# Altium schematic symbol library jlcpcb_2025_04_resistors_extended_2010.schlib: 1697 symbols (part 3 of 9) (continued)
## AC2010JK-075K1L
designator R?  Resistance: 5.1kΩ  (hidden comment: *)
Resistor, 5.1kΩ, ±5%, 750mW, ±100ppm/℃, -55℃~+155℃, SMD 2010; Manufacturer: Uniroyal; Manufacturer Part Number: AC2010JK-075K1L; Supplier 1: LCSC; Supplier Part Number 1: C230924; JLCPCB Part Number: C230924; Power Rating: 750mW; Category: Resistors; Package Size: 2010; JLCPCB Basic Part: Yes; Tolerance: ±5%; Temperature Coefficient: ±100ppm/℃; Temperature Rating: -55℃~+155℃; ComponentLink1Description: Datasheet; ComponentLink1URL: https://wmsc.lcsc.com/wmsc/upload/file/pdf/v2/lcsc/2209061730_YAGEO-AC2010JK-075K1L_C230924.pdf; ComponentLink2Description: JLCPCB Part URL; ComponentLink2URL: https://jlcpcb.com/partdetail/C230924
pins: 1, 2
1 alternate drawing of the same symbol

## AC2010JK-0710RL
designator R?  Resistance: 10Ω  (hidden comment: *)
Resistor, 10Ω, ±5%, 750mW, 200V, ±200ppm/℃, -55℃~+155℃, SMD 2010; Manufacturer: Uniroyal; Manufacturer Part Number: AC2010JK-0710RL; Supplier 1: LCSC; Supplier Part Number 1: C230833; JLCPCB Part Number: C230833; Power Rating: 750mW; Category: Resistors; Package Size: 2010; JLCPCB Basic Part: Yes; Tolerance: ±5%; Voltage Rating: 200V; Temperature Coefficient: ±200ppm/℃; Temperature Rating: -55℃~+155℃; ComponentLink1Description: Datasheet; ComponentLink1URL: https://wmsc.lcsc.com/wmsc/upload/file/pdf/v2/lcsc/1912111437_YAGEO-AC2010JK-0710RL_C230833.pdf; ComponentLink2Description: JLCPCB Part URL; ComponentLink2URL: https://jlcpcb.com/partdetail/C230833
pins: 1, 2
1 alternate drawing of the same symbol

## AC2010JK-0715RL
designator R?  Resistance: 15Ω  (hidden comment: *)
Resistor, 15Ω, ±5%, 750mW, ±100ppm/℃, -55℃~+155℃, SMD 2010; Manufacturer: Uniroyal; Manufacturer Part Number: AC2010JK-0715RL; Supplier 1: LCSC; Supplier Part Number 1: C230849; JLCPCB Part Number: C230849; Power Rating: 750mW; Category: Resistors; Package Size: 2010; JLCPCB Basic Part: Yes; Tolerance: ±5%; Temperature Coefficient: ±100ppm/℃; Temperature Rating: -55℃~+155℃; ComponentLink1Description: Datasheet; ComponentLink1URL: https://wmsc.lcsc.com/wmsc/upload/file/pdf/v2/lcsc/2209191401_YAGEO-AC2010JK-0715RL_C230849.pdf; ComponentLink2Description: JLCPCB Part URL; ComponentLink2URL: https://jlcpcb.com/partdetail/C230849
pins: 1, 2
1 alternate drawing of the same symbol

## AC2010JK-0751RL
designator R?  Resistance: 51Ω  (hidden comment: *)
Resistor, 51Ω, ±5%, 750mW, 500V, ±100ppm/℃, -55℃~+155℃, SMD 2010; Manufacturer: Uniroyal; Manufacturer Part Number: AC2010JK-0751RL; Supplier 1: LCSC; Supplier Part Number 1: C230919; JLCPCB Part Number: C230919; Power Rating: 750mW; Category: Resistors; Package Size: 2010; JLCPCB Basic Part: Yes; Tolerance: ±5%; Voltage Rating: 500V; Temperature Coefficient: ±100ppm/℃; Temperature Rating: -55℃~+155℃; ComponentLink1Description: Datasheet; ComponentLink1URL: https://wmsc.lcsc.com/wmsc/upload/file/pdf/v2/lcsc/2206241815_YAGEO-AC2010JK-0751RL_C230919.pdf; ComponentLink2Description: JLCPCB Part URL; ComponentLink2URL: https://jlcpcb.com/partdetail/C230919
pins: 1, 2
1 alternate drawing of the same symbol

## AC2010JK-07100KL
designator R?  Resistance: 100kΩ  (hidden comment: *)
Resistor, 100kΩ, ±5%, 750mW, 200V, ±100ppm/℃, -55℃~+155℃, SMD 2010; Manufacturer: Uniroyal; Manufacturer Part Number: AC2010JK-07100KL; Supplier 1: LCSC; Supplier Part Number 1: C230829; JLCPCB Part Number: C230829; Power Rating: 750mW; Category: Resistors; Package Size: 2010; JLCPCB Basic Part: Yes; Tolerance: ±5%; Voltage Rating: 200V; Temperature Coefficient: ±100ppm/℃; Temperature Rating: -55℃~+155℃; ComponentLink1Description: Datasheet; ComponentLink1URL: https://wmsc.lcsc.com/wmsc/upload/file/pdf/v2/lcsc/2203210916_YAGEO-AC2010JK-07100KL_C230829.pdf; ComponentLink2Description: JLCPCB Part URL; ComponentLink2URL: https://jlcpcb.com/partdetail/C230829
pins: 1, 2
1 alternate drawing of the same symbol

## AC2010JK-07100RL
designator R?  Resistance: 100Ω  (hidden comment: *)
Resistor, 100Ω, ±5%, 750mW, 200V, ±100ppm/℃, -55℃~+155℃, SMD 2010; Manufacturer: Uniroyal; Manufacturer Part Number: AC2010JK-07100RL; Supplier 1: LCSC; Supplier Part Number 1: C230830; JLCPCB Part Number: C230830; Power Rating: 750mW; Category: Resistors; Package Size: 2010; JLCPCB Basic Part: Yes; Tolerance: ±5%; Voltage Rating: 200V; Temperature Coefficient: ±100ppm/℃; Temperature Rating: -55℃~+155℃; ComponentLink1Description: Datasheet; ComponentLink1URL: https://wmsc.lcsc.com/wmsc/upload/file/pdf/v2/lcsc/2111171830_YAGEO-AC2010JK-07100RL_C230830.pdf; ComponentLink2Description: JLCPCB Part URL; ComponentLink2URL: https://jlcpcb.com/partdetail/C230830
pins: 1, 2
1 alternate drawing of the same symbol

## AC2010JK-07120KL
designator R?  Resistance: 120kΩ  (hidden comment: *)
Resistor, 120kΩ, ±5%, 750mW, 200V, ±100ppm/℃, -55℃~+155℃, SMD 2010; Manufacturer: Uniroyal; Manufacturer Part Number: AC2010JK-07120KL; Supplier 1: LCSC; Supplier Part Number 1: C230838; JLCPCB Part Number: C230838; Power Rating: 750mW; Category: Resistors; Package Size: 2010; JLCPCB Basic Part: Yes; Tolerance: ±5%; Voltage Rating: 200V; Temperature Coefficient: ±100ppm/℃; Temperature Rating: -55℃~+155℃; ComponentLink1Description: Datasheet; ComponentLink1URL: https://wmsc.lcsc.com/wmsc/upload/file/pdf/v2/lcsc/2112131730_YAGEO-AC2010JK-07120KL_C230838.pdf; ComponentLink2Description: JLCPCB Part URL; ComponentLink2URL: https://jlcpcb.com/partdetail/C230838
pins: 1, 2
1 alternate drawing of the same symbol

## AC2010JK-07150RL
designator R?  Resistance: 150Ω  (hidden comment: *)
Resistor, 150Ω, ±5%, 750mW, ±100ppm/℃, -55℃~+155℃, SMD 2010; Manufacturer: Uniroyal; Manufacturer Part Number: AC2010JK-07150RL; Supplier 1: LCSC; Supplier Part Number 1: C230847; JLCPCB Part Number: C230847; Power Rating: 750mW; Category: Resistors; Package Size: 2010; JLCPCB Basic Part: Yes; Tolerance: ±5%; Temperature Coefficient: ±100ppm/℃; Temperature Rating: -55℃~+155℃; ComponentLink1Description: Datasheet; ComponentLink1URL: https://wmsc.lcsc.com/wmsc/upload/file/pdf/v2/lcsc/2111101730_YAGEO-AC2010JK-07150RL_C230847.pdf; ComponentLink2Description: JLCPCB Part URL; ComponentLink2URL: https://jlcpcb.com/partdetail/C230847
pins: 1, 2
1 alternate drawing of the same symbol

## AC2010JK-07180RL
designator R?  Resistance: 180Ω  (hidden comment: *)
Resistor, 180Ω, ±5%, 750mW, 200V, ±100ppm/℃, -55℃~+155℃, SMD 2010; Manufacturer: Uniroyal; Manufacturer Part Number: AC2010JK-07180RL; Supplier 1: LCSC; Supplier Part Number 1: C230855; JLCPCB Part Number: C230855; Power Rating: 750mW; Category: Resistors; Package Size: 2010; JLCPCB Basic Part: Yes; Tolerance: ±5%; Voltage Rating: 200V; Temperature Coefficient: ±100ppm/℃; Temperature Rating: -55℃~+155℃; ComponentLink1Description: Datasheet; ComponentLink1URL: https://wmsc.lcsc.com/wmsc/upload/file/pdf/v2/lcsc/2112131730_YAGEO-AC2010JK-07180RL_C230855.pdf; ComponentLink2Description: JLCPCB Part URL; ComponentLink2URL: https://jlcpcb.com/partdetail/C230855
pins: 1, 2
1 alternate drawing of the same symbol

## AC2010JK-07200KL
designator R?  Resistance: 200kΩ  (hidden comment: *)
Resistor, 200kΩ, ±5%, 750mW, ±100ppm/℃, -55℃~+155℃, SMD 2010; Manufacturer: Uniroyal; Manufacturer Part Number: AC2010JK-07200KL; Supplier 1: LCSC; Supplier Part Number 1: C230866; JLCPCB Part Number: C230866; Power Rating: 750mW; Category: Resistors; Package Size: 2010; JLCPCB Basic Part: Yes; Tolerance: ±5%; Temperature Coefficient: ±100ppm/℃; Temperature Rating: -55℃~+155℃; ComponentLink1Description: Datasheet; ComponentLink1URL: https://wmsc.lcsc.com/wmsc/upload/file/pdf/v2/lcsc/2209191401_YAGEO-AC2010JK-07200KL_C230866.pdf; ComponentLink2Description: JLCPCB Part URL; ComponentLink2URL: https://jlcpcb.com/partdetail/C230866
pins: 1, 2
1 alternate drawing of the same symbol

## AC2010JK-07240RL
designator R?  Resistance: 240Ω  (hidden comment: *)
Resistor, 240Ω, ±5%, 750mW, ±100ppm/℃, -55℃~+155℃, SMD 2010; Manufacturer: Uniroyal; Manufacturer Part Number: AC2010JK-07240RL; Supplier 1: LCSC; Supplier Part Number 1: C230875; JLCPCB Part Number: C230875; Power Rating: 750mW; Category: Resistors; Package Size: 2010; JLCPCB Basic Part: Yes; Tolerance: ±5%; Temperature Coefficient: ±100ppm/℃; Temperature Rating: -55℃~+155℃; ComponentLink1Description: Datasheet; ComponentLink1URL: https://wmsc.lcsc.com/wmsc/upload/file/pdf/v2/lcsc/2111101730_YAGEO-AC2010JK-07240RL_C230875.pdf; ComponentLink2Description: JLCPCB Part URL; ComponentLink2URL: https://jlcpcb.com/partdetail/C230875
pins: 1, 2
1 alternate drawing of the same symbol

## AC2010JK-07360RL
designator R?  Resistance: 360Ω  (hidden comment: *)
Resistor, 360Ω, ±5%, 750mW, 200V, ±100ppm/℃, -55℃~+155℃, SMD 2010; Manufacturer: Uniroyal; Manufacturer Part Number: AC2010JK-07360RL; Supplier 1: LCSC; Supplier Part Number 1: C230895; JLCPCB Part Number: C230895; Power Rating: 750mW; Category: Resistors; Package Size: 2010; JLCPCB Basic Part: Yes; Tolerance: ±5%; Voltage Rating: 200V; Temperature Coefficient: ±100ppm/℃; Temperature Rating: -55℃~+155℃; ComponentLink1Description: Datasheet; ComponentLink1URL: https://wmsc.lcsc.com/wmsc/upload/file/pdf/v2/lcsc/2203081130_YAGEO-AC2010JK-07360RL_C230895.pdf; ComponentLink2Description: JLCPCB Part URL; ComponentLink2URL: https://jlcpcb.com/partdetail/C230895
pins: 1, 2
1 alternate drawing of the same symbol

## AC2010JK-07390RL
designator R?  Resistance: 390Ω  (hidden comment: *)
Resistor, 390Ω, ±5%, 750mW, 200V, ±100ppm/℃, -55℃~+155℃, SMD 2010; Manufacturer: Uniroyal; Manufacturer Part Number: AC2010JK-07390RL; Supplier 1: LCSC; Supplier Part Number 1: C230899; JLCPCB Part Number: C230899; Power Rating: 750mW; Category: Resistors; Package Size: 2010; JLCPCB Basic Part: Yes; Tolerance: ±5%; Voltage Rating: 200V; Temperature Coefficient: ±100ppm/℃; Temperature Rating: -55℃~+155℃; ComponentLink1Description: Datasheet; ComponentLink1URL: https://wmsc.lcsc.com/wmsc/upload/file/pdf/v2/lcsc/2110191430_YAGEO-AC2010JK-07390RL_C230899.pdf; ComponentLink2Description: JLCPCB Part URL; ComponentLink2URL: https://jlcpcb.com/partdetail/C230899
pins: 1, 2
1 alternate drawing of the same symbol

## AC2010JK-07470RL
designator R?  Resistance: 470Ω  (hidden comment: *)
Resistor, 470Ω, ±5%, 750mW, 200V, ±100ppm/℃, -55℃~+155℃, SMD 2010; Manufacturer: Uniroyal; Manufacturer Part Number: AC2010JK-07470RL; Supplier 1: LCSC; Supplier Part Number 1: C230911; JLCPCB Part Number: C230911; Power Rating: 750mW; Category: Resistors; Package Size: 2010; JLCPCB Basic Part: Yes; Tolerance: ±5%; Voltage Rating: 200V; Temperature Coefficient: ±100ppm/℃; Temperature Rating: -55℃~+155℃; ComponentLink1Description: Datasheet; ComponentLink1URL: https://wmsc.lcsc.com/wmsc/upload/file/pdf/v2/lcsc/2304140030_YAGEO-AC2010JK-07470RL_C230911.pdf; ComponentLink2Description: JLCPCB Part URL; ComponentLink2URL: https://jlcpcb.com/partdetail/C230911
pins: 1, 2
1 alternate drawing of the same symbol

## AC2010JK-07510RL
designator R?  Resistance: 510Ω  (hidden comment: *)
Resistor, 510Ω, ±5%, 750mW, ±100ppm/℃, -55℃~+155℃, SMD 2010; Manufacturer: Uniroyal; Manufacturer Part Number: AC2010JK-07510RL; Supplier 1: LCSC; Supplier Part Number 1: C230917; JLCPCB Part Number: C230917; Power Rating: 750mW; Category: Resistors; Package Size: 2010; JLCPCB Basic Part: Yes; Tolerance: ±5%; Temperature Coefficient: ±100ppm/℃; Temperature Rating: -55℃~+155℃; ComponentLink1Description: Datasheet; ComponentLink1URL: https://wmsc.lcsc.com/wmsc/upload/file/pdf/v2/lcsc/2111101730_YAGEO-AC2010JK-07510RL_C230917.pdf; ComponentLink2Description: JLCPCB Part URL; ComponentLink2URL: https://jlcpcb.com/partdetail/C230917
pins: 1, 2
1 alternate drawing of the same symbol

## AC2010JK-07620RL
designator R?  Resistance: 620Ω  (hidden comment: *)
Resistor, 620Ω, ±5%, 750mW, 200V, ±100ppm/℃, -55℃~+155℃, SMD 2010; Manufacturer: Uniroyal; Manufacturer Part Number: AC2010JK-07620RL; Supplier 1: LCSC; Supplier Part Number 1: C230927; JLCPCB Part Number: C230927; Power Rating: 750mW; Category: Resistors; Package Size: 2010; JLCPCB Basic Part: Yes; Tolerance: ±5%; Voltage Rating: 200V; Temperature Coefficient: ±100ppm/℃; Temperature Rating: -55℃~+155℃; ComponentLink1Description: Datasheet; ComponentLink1URL: https://wmsc.lcsc.com/wmsc/upload/file/pdf/v2/lcsc/2111171830_YAGEO-AC2010JK-07620RL_C230927.pdf; ComponentLink2Description: JLCPCB Part URL; ComponentLink2URL: https://jlcpcb.com/partdetail/C230927
pins: 1, 2
1 alternate drawing of the same symbol

## AECR2010F0000K9
designator R?  Resistance: 0Ω  (hidden comment: *)
Resistor, 0Ω, ±1%, 750mW, SMD 2010; Manufacturer: Uniroyal; Manufacturer Part Number: AECR2010F0000K9; Supplier 1: LCSC; Supplier Part Number 1: C351874; JLCPCB Part Number: C351874; Power Rating: 750mW; Category: Resistors; Package Size: 2010; JLCPCB Basic Part: Yes; Tolerance: ±1%; ComponentLink1Description: Datasheet; ComponentLink1URL: https://wmsc.lcsc.com/wmsc/upload/file/pdf/v2/lcsc/2304140030_RESI-AECR2010F0000K9_C351874.pdf; ComponentLink2Description: JLCPCB Part URL; ComponentLink2URL: https://jlcpcb.com/partdetail/C351874
pins: 1, 2
1 alternate drawing of the same symbol

## AECR2010F1M00K9
designator R?  Resistance: 1MΩ  (hidden comment: *)
Resistor, 1MΩ, ±1%, 750mW, 200V, ±100ppm/℃, -55℃~+125℃, SMD 2010; Manufacturer: Uniroyal; Manufacturer Part Number: AECR2010F1M00K9; Supplier 1: LCSC; Supplier Part Number 1: C351857; JLCPCB Part Number: C351857; Power Rating: 750mW; Category: Resistors; Package Size: 2010; JLCPCB Basic Part: Yes; Tolerance: ±1%; Voltage Rating: 200V; Temperature Coefficient: ±100ppm/℃; Temperature Rating: -55℃~+125℃; ComponentLink1Description: Datasheet; ComponentLink1URL: https://wmsc.lcsc.com/wmsc/upload/file/pdf/v2/lcsc/2304140030_RESI-AECR2010F1M00K9_C351857.pdf; ComponentLink2Description: JLCPCB Part URL; ComponentLink2URL: https://jlcpcb.com/partdetail/C351857
pins: 1, 2
1 alternate drawing of the same symbol

## AECR2010F1R50S9
designator R?  Resistance: 1.5Ω  (hidden comment: *)
Resistor, 1.5Ω, ±1%, 750mW, ±250ppm/℃, SMD 2010; Manufacturer: Uniroyal; Manufacturer Part Number: AECR2010F1R50S9; Supplier 1: LCSC; Supplier Part Number 1: C2849029; JLCPCB Part Number: C2849029; Power Rating: 750mW; Category: Resistors; Package Size: 2010; JLCPCB Basic Part: Yes; Tolerance: ±1%; Temperature Coefficient: ±250ppm/℃; ComponentLink1Description: Datasheet; ComponentLink1URL: https://wmsc.lcsc.com/wmsc/upload/file/pdf/v2/lcsc/2311171200_RESI-AECR2010F1R50S9_C2849029.pdf; ComponentLink2Description: JLCPCB Part URL; ComponentLink2URL: https://jlcpcb.com/partdetail/C2849029
pins: 1, 2
1 alternate drawing of the same symbol

## AECR2010F120RK9
designator R?  Resistance: 120Ω  (hidden comment: *)
Resistor, 120Ω, ±1%, 750mW, SMD 2010; Manufacturer: Uniroyal; Manufacturer Part Number: AECR2010F120RK9; Supplier 1: LCSC; Supplier Part Number 1: C351867; JLCPCB Part Number: C351867; Power Rating: 750mW; Category: Resistors; Package Size: 2010; JLCPCB Basic Part: Yes; Tolerance: ±1%; ComponentLink1Description: Datasheet; ComponentLink1URL: https://wmsc.lcsc.com/wmsc/upload/file/pdf/v2/lcsc/2304140030_RESI-AECR2010F120RK9_C351867.pdf; ComponentLink2Description: JLCPCB Part URL; ComponentLink2URL: https://jlcpcb.com/partdetail/C351867
pins: 1, 2
1 alternate drawing of the same symbol

## AECR2010F510RK9
designator R?  Resistance: 510Ω  (hidden comment: *)
Resistor, 510Ω, ±1%, 750mW, 200V, ±100ppm/℃, -55℃~+125℃, SMD 2010; Manufacturer: Uniroyal; Manufacturer Part Number: AECR2010F510RK9; Supplier 1: LCSC; Supplier Part Number 1: C351766; JLCPCB Part Number: C351766; Power Rating: 750mW; Category: Resistors; Package Size: 2010; JLCPCB Basic Part: Yes; Tolerance: ±1%; Voltage Rating: 200V; Temperature Coefficient: ±100ppm/℃; Temperature Rating: -55℃~+125℃; ComponentLink1Description: Datasheet; ComponentLink1URL: https://wmsc.lcsc.com/wmsc/upload/file/pdf/v2/lcsc/2304140030_RESI-AECR2010F510RK9_C351766.pdf; ComponentLink2Description: JLCPCB Part URL; ComponentLink2URL: https://jlcpcb.com/partdetail/C351766
pins: 1, 2
1 alternate drawing of the same symbol

## AF2010FK-0722RL
designator R?  Resistance: 22Ω  (hidden comment: *)
Resistor, 22Ω, ±1%, 750mW, 200V, ±100ppm/℃, -55℃~+155℃, SMD 2010; Manufacturer: Uniroyal; Manufacturer Part Number: AF2010FK-0722RL; Supplier 1: LCSC; Supplier Part Number 1: C2936606; JLCPCB Part Number: C2936606; Power Rating: 750mW; Category: Resistors; Package Size: 2010; JLCPCB Basic Part: Yes; Tolerance: ±1%; Voltage Rating: 200V; Temperature Coefficient: ±100ppm/℃; Temperature Rating: -55℃~+155℃; ComponentLink1Description: Datasheet; ComponentLink1URL: https://wmsc.lcsc.com/wmsc/upload/file/pdf/v2/lcsc/2201121730_YAGEO-AF2010FK-0722RL_C2936606.pdf; ComponentLink2Description: JLCPCB Part URL; ComponentLink2URL: https://jlcpcb.com/partdetail/C2936606
pins: 1, 2
1 alternate drawing of the same symbol

## AR10BTC9650
designator R?  Resistance: 965Ω  (hidden comment: *)
Resistor, 965Ω, ±0.1%, 250mW, 150V, ±25ppm/℃, -55℃~+155℃, SMD 2010; Manufacturer: Uniroyal; Manufacturer Part Number: AR10BTC9650; Supplier 1: LCSC; Supplier Part Number 1: C465456; JLCPCB Part Number: C465456; Power Rating: 250mW; Category: Resistors; Package Size: 2010; JLCPCB Basic Part: Yes; Tolerance: ±0.1%; Voltage Rating: 150V; Temperature Coefficient: ±25ppm/℃; Temperature Rating: -55℃~+155℃; ComponentLink1Description: Datasheet; ComponentLink1URL: https://wmsc.lcsc.com/wmsc/upload/file/pdf/v2/lcsc/2304140030_Viking-Tech-AR10BTC9650_C465456.pdf; ComponentLink2Description: JLCPCB Part URL; ComponentLink2URL: https://jlcpcb.com/partdetail/C465456
pins: 1, 2
1 alternate drawing of the same symbol

## AR10BTS2500
designator R?  Resistance: 250Ω  (hidden comment: *)
Resistor, 250Ω, ±0.1%, 250mW, 150V, ±5ppm/℃, -55℃~+155℃, SMD 2010; Manufacturer: Uniroyal; Manufacturer Part Number: AR10BTS2500; Supplier 1: LCSC; Supplier Part Number 1: C374841; JLCPCB Part Number: C374841; Power Rating: 250mW; Category: Resistors; Package Size: 2010; JLCPCB Basic Part: Yes; Tolerance: ±0.1%; Voltage Rating: 150V; Temperature Coefficient: ±5ppm/℃; Temperature Rating: -55℃~+155℃; ComponentLink1Description: Datasheet; ComponentLink1URL: https://wmsc.lcsc.com/wmsc/upload/file/pdf/v2/lcsc/2304140030_Viking-Tech-AR10BTS2500_C374841.pdf; ComponentLink2Description: JLCPCB Part URL; ComponentLink2URL: https://jlcpcb.com/partdetail/C374841
pins: 1, 2
1 alternate drawing of the same symbol

## AR10FTCO0500
designator R?  Resistance: 50Ω  (hidden comment: *)
Resistor, 50Ω, ±1%, 333.333mW, ±25ppm/℃, SMD 2010; Manufacturer: Uniroyal; Manufacturer Part Number: AR10FTCO0500; Supplier 1: LCSC; Supplier Part Number 1: C3294591; JLCPCB Part Number: C3294591; Power Rating: 333.333mW; Category: Resistors; Package Size: 2010; JLCPCB Basic Part: Yes; Tolerance: ±1%; Temperature Coefficient: ±25ppm/℃; ComponentLink1Description: Datasheet; ComponentLink1URL: https://wmsc.lcsc.com/wmsc/upload/file/pdf/v2/lcsc/2206301900_Viking-Tech-AR10FTCO0500_C3294591.pdf; ComponentLink2Description: JLCPCB Part URL; ComponentLink2URL: https://jlcpcb.com/partdetail/C3294591
pins: 1, 2
1 alternate drawing of the same symbol

## AS101AJ010JT4E
designator R?  Resistance: 1Ω  (hidden comment: *)
Resistor, 1Ω, ±5%, 1.5W, ±400ppm/℃, SMD 2010; Manufacturer: Uniroyal; Manufacturer Part Number: AS101AJ010JT4E; Supplier 1: LCSC; Supplier Part Number 1: C965990; JLCPCB Part Number: C965990; Power Rating: 1.5W; Category: Resistors; Package Size: 2010; JLCPCB Basic Part: Yes; Tolerance: ±5%; Temperature Coefficient: ±400ppm/℃; ComponentLink1Description: Datasheet; ComponentLink1URL: https://wmsc.lcsc.com/wmsc/upload/file/pdf/v2/lcsc/2304140030_UNI-ROYAL-Uniroyal-Elec-AS101AJ010JT4E_C965990.pdf; ComponentLink2Description: JLCPCB Part URL; ComponentLink2URL: https://jlcpcb.com/partdetail/C965990
pins: 1, 2
1 alternate drawing of the same symbol

## AS101AJ020JT4E
designator R?  Resistance: 2Ω  (hidden comment: *)
Resistor, 2Ω, ±5%, 1.5W, ±400ppm/℃, SMD 2010; Manufacturer: Uniroyal; Manufacturer Part Number: AS101AJ020JT4E; Supplier 1: LCSC; Supplier Part Number 1: C965983; JLCPCB Part Number: C965983; Power Rating: 1.5W; Category: Resistors; Package Size: 2010; JLCPCB Basic Part: Yes; Tolerance: ±5%; Temperature Coefficient: ±400ppm/℃; ComponentLink1Description: Datasheet; ComponentLink1URL: https://wmsc.lcsc.com/wmsc/upload/file/pdf/v2/lcsc/2304140030_UNI-ROYAL-Uniroyal-Elec-AS101AJ020JT4E_C965983.pdf; ComponentLink2Description: JLCPCB Part URL; ComponentLink2URL: https://jlcpcb.com/partdetail/C965983
pins: 1, 2
1 alternate drawing of the same symbol

## AS101AJ022JT4E
designator R?  Resistance: 2.2Ω  (hidden comment: *)
Resistor, 2.2Ω, ±5%, 1.5W, ±400ppm/℃, SMD 2010; Manufacturer: Uniroyal; Manufacturer Part Number: AS101AJ022JT4E; Supplier 1: LCSC; Supplier Part Number 1: C965979; JLCPCB Part Number: C965979; Power Rating: 1.5W; Category: Resistors; Package Size: 2010; JLCPCB Basic Part: Yes; Tolerance: ±5%; Temperature Coefficient: ±400ppm/℃; ComponentLink1Description: Datasheet; ComponentLink1URL: https://wmsc.lcsc.com/wmsc/upload/file/pdf/v2/lcsc/2304140030_UNI-ROYAL-Uniroyal-Elec-AS101AJ022JT4E_C965979.pdf; ComponentLink2Description: JLCPCB Part URL; ComponentLink2URL: https://jlcpcb.com/partdetail/C965979
pins: 1, 2
1 alternate drawing of the same symbol

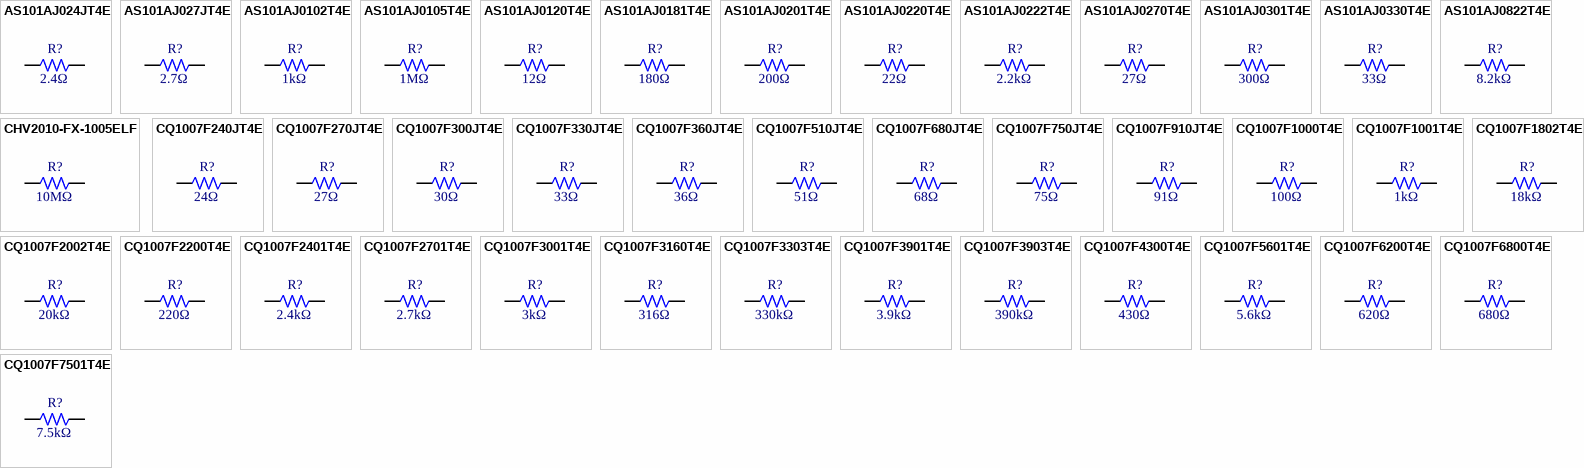
[diagram p14: symbols AS101AJ024JT4E to CQ1007F7501T4E]

## AS101AJ024JT4E
designator R?  Resistance: 2.4Ω  (hidden comment: *)
Resistor, 2.4Ω, ±5%, 1.5W, ±400ppm/℃, SMD 2010; Manufacturer: Uniroyal; Manufacturer Part Number: AS101AJ024JT4E; Supplier 1: LCSC; Supplier Part Number 1: C965976; JLCPCB Part Number: C965976; Power Rating: 1.5W; Category: Resistors; Package Size: 2010; JLCPCB Basic Part: Yes; Tolerance: ±5%; Temperature Coefficient: ±400ppm/℃; ComponentLink1Description: Datasheet; ComponentLink1URL: https://wmsc.lcsc.com/wmsc/upload/file/pdf/v2/lcsc/2304140030_UNI-ROYAL-Uniroyal-Elec-AS101AJ024JT4E_C965976.pdf; ComponentLink2Description: JLCPCB Part URL; ComponentLink2URL: https://jlcpcb.com/partdetail/C965976
pins: 1, 2
1 alternate drawing of the same symbol

## AS101AJ027JT4E
designator R?  Resistance: 2.7Ω  (hidden comment: *)
Resistor, 2.7Ω, ±5%, 1.5W, ±400ppm/℃, SMD 2010; Manufacturer: Uniroyal; Manufacturer Part Number: AS101AJ027JT4E; Supplier 1: LCSC; Supplier Part Number 1: C965973; JLCPCB Part Number: C965973; Power Rating: 1.5W; Category: Resistors; Package Size: 2010; JLCPCB Basic Part: Yes; Tolerance: ±5%; Temperature Coefficient: ±400ppm/℃; ComponentLink1Description: Datasheet; ComponentLink1URL: https://wmsc.lcsc.com/wmsc/upload/file/pdf/v2/lcsc/2304140030_UNI-ROYAL-Uniroyal-Elec-AS101AJ027JT4E_C965973.pdf; ComponentLink2Description: JLCPCB Part URL; ComponentLink2URL: https://jlcpcb.com/partdetail/C965973
pins: 1, 2
1 alternate drawing of the same symbol

## AS101AJ0102T4E
designator R?  Resistance: 1kΩ  (hidden comment: *)
Resistor, 1kΩ, ±5%, 1.5W, ±100ppm/℃, SMD 2010; Manufacturer: Uniroyal; Manufacturer Part Number: AS101AJ0102T4E; Supplier 1: LCSC; Supplier Part Number 1: C965993; JLCPCB Part Number: C965993; Power Rating: 1.5W; Category: Resistors; Package Size: 2010; JLCPCB Basic Part: Yes; Tolerance: ±5%; Temperature Coefficient: ±100ppm/℃; ComponentLink1Description: Datasheet; ComponentLink1URL: https://wmsc.lcsc.com/wmsc/upload/file/pdf/v2/lcsc/2304140030_UNI-ROYAL-Uniroyal-Elec-AS101AJ0102T4E_C965993.pdf; ComponentLink2Description: JLCPCB Part URL; ComponentLink2URL: https://jlcpcb.com/partdetail/C965993
pins: 1, 2
1 alternate drawing of the same symbol

## AS101AJ0105T4E
designator R?  Resistance: 1MΩ  (hidden comment: *)
Resistor, 1MΩ, ±5%, 1.5W, ±100ppm/℃, SMD 2010; Manufacturer: Uniroyal; Manufacturer Part Number: AS101AJ0105T4E; Supplier 1: LCSC; Supplier Part Number 1: C965991; JLCPCB Part Number: C965991; Power Rating: 1.5W; Category: Resistors; Package Size: 2010; JLCPCB Basic Part: Yes; Tolerance: ±5%; Temperature Coefficient: ±100ppm/℃; ComponentLink1Description: Datasheet; ComponentLink1URL: https://wmsc.lcsc.com/wmsc/upload/file/pdf/v2/lcsc/2304140030_UNI-ROYAL-Uniroyal-Elec-AS101AJ0105T4E_C965991.pdf; ComponentLink2Description: JLCPCB Part URL; ComponentLink2URL: https://jlcpcb.com/partdetail/C965991
pins: 1, 2
1 alternate drawing of the same symbol

## AS101AJ0120T4E
designator R?  Resistance: 12Ω  (hidden comment: *)
Resistor, 12Ω, ±5%, 1.5W, ±100ppm/℃, SMD 2010; Manufacturer: Uniroyal; Manufacturer Part Number: AS101AJ0120T4E; Supplier 1: LCSC; Supplier Part Number 1: C965989; JLCPCB Part Number: C965989; Power Rating: 1.5W; Category: Resistors; Package Size: 2010; JLCPCB Basic Part: Yes; Tolerance: ±5%; Temperature Coefficient: ±100ppm/℃; ComponentLink1Description: Datasheet; ComponentLink1URL: https://wmsc.lcsc.com/wmsc/upload/file/pdf/v2/lcsc/2304140030_UNI-ROYAL-Uniroyal-Elec-AS101AJ0120T4E_C965989.pdf; ComponentLink2Description: JLCPCB Part URL; ComponentLink2URL: https://jlcpcb.com/partdetail/C965989
pins: 1, 2
1 alternate drawing of the same symbol

## AS101AJ0181T4E
designator R?  Resistance: 180Ω  (hidden comment: *)
Resistor, 180Ω, ±5%, 1.5W, ±100ppm/℃, SMD 2010; Manufacturer: Uniroyal; Manufacturer Part Number: AS101AJ0181T4E; Supplier 1: LCSC; Supplier Part Number 1: C965987; JLCPCB Part Number: C965987; Power Rating: 1.5W; Category: Resistors; Package Size: 2010; JLCPCB Basic Part: Yes; Tolerance: ±5%; Temperature Coefficient: ±100ppm/℃; ComponentLink1Description: Datasheet; ComponentLink1URL: https://wmsc.lcsc.com/wmsc/upload/file/pdf/v2/lcsc/2304140030_UNI-ROYAL-Uniroyal-Elec-AS101AJ0181T4E_C965987.pdf; ComponentLink2Description: JLCPCB Part URL; ComponentLink2URL: https://jlcpcb.com/partdetail/C965987
pins: 1, 2
1 alternate drawing of the same symbol

## AS101AJ0201T4E
designator R?  Resistance: 200Ω  (hidden comment: *)
Resistor, 200Ω, ±5%, 1.5W, ±100ppm/℃, SMD 2010; Manufacturer: Uniroyal; Manufacturer Part Number: AS101AJ0201T4E; Supplier 1: LCSC; Supplier Part Number 1: C965985; JLCPCB Part Number: C965985; Power Rating: 1.5W; Category: Resistors; Package Size: 2010; JLCPCB Basic Part: Yes; Tolerance: ±5%; Temperature Coefficient: ±100ppm/℃; ComponentLink1Description: Datasheet; ComponentLink1URL: https://wmsc.lcsc.com/wmsc/upload/file/pdf/v2/lcsc/2304140030_UNI-ROYAL-Uniroyal-Elec-AS101AJ0201T4E_C965985.pdf; ComponentLink2Description: JLCPCB Part URL; ComponentLink2URL: https://jlcpcb.com/partdetail/C965985
pins: 1, 2
1 alternate drawing of the same symbol

## AS101AJ0220T4E
designator R?  Resistance: 22Ω  (hidden comment: *)
Resistor, 22Ω, ±5%, 1.5W, ±100ppm/℃, SMD 2010; Manufacturer: Uniroyal; Manufacturer Part Number: AS101AJ0220T4E; Supplier 1: LCSC; Supplier Part Number 1: C965982; JLCPCB Part Number: C965982; Power Rating: 1.5W; Category: Resistors; Package Size: 2010; JLCPCB Basic Part: Yes; Tolerance: ±5%; Temperature Coefficient: ±100ppm/℃; ComponentLink1Description: Datasheet; ComponentLink1URL: https://wmsc.lcsc.com/wmsc/upload/file/pdf/v2/lcsc/2304140030_UNI-ROYAL-Uniroyal-Elec-AS101AJ0220T4E_C965982.pdf; ComponentLink2Description: JLCPCB Part URL; ComponentLink2URL: https://jlcpcb.com/partdetail/C965982
pins: 1, 2
1 alternate drawing of the same symbol

## AS101AJ0222T4E
designator R?  Resistance: 2.2kΩ  (hidden comment: *)
Resistor, 2.2kΩ, ±5%, 1.5W, ±100ppm/℃, SMD 2010; Manufacturer: Uniroyal; Manufacturer Part Number: AS101AJ0222T4E; Supplier 1: LCSC; Supplier Part Number 1: C965981; JLCPCB Part Number: C965981; Power Rating: 1.5W; Category: Resistors; Package Size: 2010; JLCPCB Basic Part: Yes; Tolerance: ±5%; Temperature Coefficient: ±100ppm/℃; ComponentLink1Description: Datasheet; ComponentLink1URL: https://wmsc.lcsc.com/wmsc/upload/file/pdf/v2/lcsc/2304140030_UNI-ROYAL-Uniroyal-Elec-AS101AJ0222T4E_C965981.pdf; ComponentLink2Description: JLCPCB Part URL; ComponentLink2URL: https://jlcpcb.com/partdetail/C965981
pins: 1, 2
1 alternate drawing of the same symbol

## AS101AJ0270T4E
designator R?  Resistance: 27Ω  (hidden comment: *)
Resistor, 27Ω, ±5%, 1.5W, ±100ppm/℃, SMD 2010; Manufacturer: Uniroyal; Manufacturer Part Number: AS101AJ0270T4E; Supplier 1: LCSC; Supplier Part Number 1: C965975; JLCPCB Part Number: C965975; Power Rating: 1.5W; Category: Resistors; Package Size: 2010; JLCPCB Basic Part: Yes; Tolerance: ±5%; Temperature Coefficient: ±100ppm/℃; ComponentLink1Description: Datasheet; ComponentLink1URL: https://wmsc.lcsc.com/wmsc/upload/file/pdf/v2/lcsc/2304140030_UNI-ROYAL-Uniroyal-Elec-AS101AJ0270T4E_C965975.pdf; ComponentLink2Description: JLCPCB Part URL; ComponentLink2URL: https://jlcpcb.com/partdetail/C965975
pins: 1, 2
1 alternate drawing of the same symbol

## AS101AJ0301T4E
designator R?  Resistance: 300Ω  (hidden comment: *)
Resistor, 300Ω, ±5%, 1.5W, ±100ppm/℃, SMD 2010; Manufacturer: Uniroyal; Manufacturer Part Number: AS101AJ0301T4E; Supplier 1: LCSC; Supplier Part Number 1: C965972; JLCPCB Part Number: C965972; Power Rating: 1.5W; Category: Resistors; Package Size: 2010; JLCPCB Basic Part: Yes; Tolerance: ±5%; Temperature Coefficient: ±100ppm/℃; ComponentLink1Description: Datasheet; ComponentLink1URL: https://wmsc.lcsc.com/wmsc/upload/file/pdf/v2/lcsc/2304140030_UNI-ROYAL-Uniroyal-Elec-AS101AJ0301T4E_C965972.pdf; ComponentLink2Description: JLCPCB Part URL; ComponentLink2URL: https://jlcpcb.com/partdetail/C965972
pins: 1, 2
1 alternate drawing of the same symbol

## AS101AJ0330T4E
designator R?  Resistance: 33Ω  (hidden comment: *)
Resistor, 33Ω, ±5%, 1.5W, ±100ppm/℃, SMD 2010; Manufacturer: Uniroyal; Manufacturer Part Number: AS101AJ0330T4E; Supplier 1: LCSC; Supplier Part Number 1: C965971; JLCPCB Part Number: C965971; Power Rating: 1.5W; Category: Resistors; Package Size: 2010; JLCPCB Basic Part: Yes; Tolerance: ±5%; Temperature Coefficient: ±100ppm/℃; ComponentLink1Description: Datasheet; ComponentLink1URL: https://wmsc.lcsc.com/wmsc/upload/file/pdf/v2/lcsc/2304140030_UNI-ROYAL-Uniroyal-Elec-AS101AJ0330T4E_C965971.pdf; ComponentLink2Description: JLCPCB Part URL; ComponentLink2URL: https://jlcpcb.com/partdetail/C965971
pins: 1, 2
1 alternate drawing of the same symbol

## AS101AJ0822T4E
designator R?  Resistance: 8.2kΩ  (hidden comment: *)
Resistor, 8.2kΩ, ±5%, 1.5W, ±100ppm/℃, SMD 2010; Manufacturer: Uniroyal; Manufacturer Part Number: AS101AJ0822T4E; Supplier 1: LCSC; Supplier Part Number 1: C965965; JLCPCB Part Number: C965965; Power Rating: 1.5W; Category: Resistors; Package Size: 2010; JLCPCB Basic Part: Yes; Tolerance: ±5%; Temperature Coefficient: ±100ppm/℃; ComponentLink1Description: Datasheet; ComponentLink1URL: https://wmsc.lcsc.com/wmsc/upload/file/pdf/v2/lcsc/2304140030_UNI-ROYAL-Uniroyal-Elec-AS101AJ0822T4E_C965965.pdf; ComponentLink2Description: JLCPCB Part URL; ComponentLink2URL: https://jlcpcb.com/partdetail/C965965
pins: 1, 2
1 alternate drawing of the same symbol

## CHV2010-FX-1005ELF
designator R?  Resistance: 10MΩ  (hidden comment: *)
Resistor, 10MΩ, ±1%, 500mW, 2kV, ±100ppm/℃, -55℃~+155℃, SMD 2010; Manufacturer: Uniroyal; Manufacturer Part Number: CHV2010-FX-1005ELF; Supplier 1: LCSC; Supplier Part Number 1: C2075112; JLCPCB Part Number: C2075112; Power Rating: 500mW; Category: Resistors; Package Size: 2010; JLCPCB Basic Part: Yes; Tolerance: ±1%; Voltage Rating: 2kV; Temperature Coefficient: ±100ppm/℃; Temperature Rating: -55℃~+155℃; ComponentLink1Description: Datasheet; ComponentLink1URL: https://wmsc.lcsc.com/wmsc/upload/file/pdf/v2/lcsc/2304140030_BOURNS-CHV2010-FX-1005ELF_C2075112.pdf; ComponentLink2Description: JLCPCB Part URL; ComponentLink2URL: https://jlcpcb.com/partdetail/C2075112
pins: 1, 2
1 alternate drawing of the same symbol

## CQ1007F240JT4E
designator R?  Resistance: 24Ω  (hidden comment: *)
Resistor, 24Ω, ±1%, 750mW, 200V, -55℃~+155℃, SMD 2010; Manufacturer: Uniroyal; Manufacturer Part Number: CQ1007F240JT4E; Supplier 1: LCSC; Supplier Part Number 1: C2759562; JLCPCB Part Number: C2759562; Power Rating: 750mW; Category: Resistors; Package Size: 2010; JLCPCB Basic Part: Yes; Tolerance: ±1%; Voltage Rating: 200V; Temperature Rating: -55℃~+155℃; ComponentLink1Description: Datasheet; ComponentLink1URL: https://wmsc.lcsc.com/wmsc/upload/file/pdf/v2/lcsc/2304140030_UNI-ROYAL-Uniroyal-Elec-CQ1007F240JT4E_C2759562.pdf; ComponentLink2Description: JLCPCB Part URL; ComponentLink2URL: https://jlcpcb.com/partdetail/C2759562
pins: 1, 2
1 alternate drawing of the same symbol

## CQ1007F270JT4E
designator R?  Resistance: 27Ω  (hidden comment: *)
Resistor, 27Ω, ±1%, 750mW, 200V, -55℃~+155℃, SMD 2010; Manufacturer: Uniroyal; Manufacturer Part Number: CQ1007F270JT4E; Supplier 1: LCSC; Supplier Part Number 1: C2759561; JLCPCB Part Number: C2759561; Power Rating: 750mW; Category: Resistors; Package Size: 2010; JLCPCB Basic Part: Yes; Tolerance: ±1%; Voltage Rating: 200V; Temperature Rating: -55℃~+155℃; ComponentLink1Description: Datasheet; ComponentLink1URL: https://wmsc.lcsc.com/wmsc/upload/file/pdf/v2/lcsc/2304140030_UNI-ROYAL-Uniroyal-Elec-CQ1007F270JT4E_C2759561.pdf; ComponentLink2Description: JLCPCB Part URL; ComponentLink2URL: https://jlcpcb.com/partdetail/C2759561
pins: 1, 2
1 alternate drawing of the same symbol

## CQ1007F300JT4E
designator R?  Resistance: 30Ω  (hidden comment: *)
Resistor, 30Ω, ±1%, 750mW, ±100ppm/℃, SMD 2010; Manufacturer: Uniroyal; Manufacturer Part Number: CQ1007F300JT4E; Supplier 1: LCSC; Supplier Part Number 1: C966275; JLCPCB Part Number: C966275; Power Rating: 750mW; Category: Resistors; Package Size: 2010; JLCPCB Basic Part: Yes; Tolerance: ±1%; Temperature Coefficient: ±100ppm/℃; ComponentLink1Description: Datasheet; ComponentLink1URL: https://wmsc.lcsc.com/wmsc/upload/file/pdf/v2/lcsc/2304140030_UNI-ROYAL-Uniroyal-Elec-CQ1007F300JT4E_C966275.pdf; ComponentLink2Description: JLCPCB Part URL; ComponentLink2URL: https://jlcpcb.com/partdetail/C966275
pins: 1, 2
1 alternate drawing of the same symbol

## CQ1007F330JT4E
designator R?  Resistance: 33Ω  (hidden comment: *)
Resistor, 33Ω, ±1%, 750mW, 200V, -55℃~+155℃, SMD 2010; Manufacturer: Uniroyal; Manufacturer Part Number: CQ1007F330JT4E; Supplier 1: LCSC; Supplier Part Number 1: C2759560; JLCPCB Part Number: C2759560; Power Rating: 750mW; Category: Resistors; Package Size: 2010; JLCPCB Basic Part: Yes; Tolerance: ±1%; Voltage Rating: 200V; Temperature Rating: -55℃~+155℃; ComponentLink1Description: Datasheet; ComponentLink1URL: https://wmsc.lcsc.com/wmsc/upload/file/pdf/v2/lcsc/2304140030_UNI-ROYAL-Uniroyal-Elec-CQ1007F330JT4E_C2759560.pdf; ComponentLink2Description: JLCPCB Part URL; ComponentLink2URL: https://jlcpcb.com/partdetail/C2759560
pins: 1, 2
1 alternate drawing of the same symbol

## CQ1007F360JT4E
designator R?  Resistance: 36Ω  (hidden comment: *)
Resistor, 36Ω, ±1%, 750mW, ±100ppm/℃, SMD 2010; Manufacturer: Uniroyal; Manufacturer Part Number: CQ1007F360JT4E; Supplier 1: LCSC; Supplier Part Number 1: C966272; JLCPCB Part Number: C966272; Power Rating: 750mW; Category: Resistors; Package Size: 2010; JLCPCB Basic Part: Yes; Tolerance: ±1%; Temperature Coefficient: ±100ppm/℃; ComponentLink1Description: Datasheet; ComponentLink1URL: https://wmsc.lcsc.com/wmsc/upload/file/pdf/v2/lcsc/2304140030_UNI-ROYAL-Uniroyal-Elec-CQ1007F360JT4E_C966272.pdf; ComponentLink2Description: JLCPCB Part URL; ComponentLink2URL: https://jlcpcb.com/partdetail/C966272
pins: 1, 2
1 alternate drawing of the same symbol

## CQ1007F510JT4E
designator R?  Resistance: 51Ω  (hidden comment: *)
Resistor, 51Ω, ±1%, 750mW, ±100ppm/℃, SMD 2010; Manufacturer: Uniroyal; Manufacturer Part Number: CQ1007F510JT4E; Supplier 1: LCSC; Supplier Part Number 1: C966264; JLCPCB Part Number: C966264; Power Rating: 750mW; Category: Resistors; Package Size: 2010; JLCPCB Basic Part: Yes; Tolerance: ±1%; Temperature Coefficient: ±100ppm/℃; ComponentLink1Description: Datasheet; ComponentLink1URL: https://wmsc.lcsc.com/wmsc/upload/file/pdf/v2/lcsc/2304140030_UNI-ROYAL-Uniroyal-Elec-CQ1007F510JT4E_C966264.pdf; ComponentLink2Description: JLCPCB Part URL; ComponentLink2URL: https://jlcpcb.com/partdetail/C966264
pins: 1, 2
1 alternate drawing of the same symbol

## CQ1007F680JT4E
designator R?  Resistance: 68Ω  (hidden comment: *)
Resistor, 68Ω, ±1%, 750mW, ±100ppm/℃, SMD 2010; Manufacturer: Uniroyal; Manufacturer Part Number: CQ1007F680JT4E; Supplier 1: LCSC; Supplier Part Number 1: C966258; JLCPCB Part Number: C966258; Power Rating: 750mW; Category: Resistors; Package Size: 2010; JLCPCB Basic Part: Yes; Tolerance: ±1%; Temperature Coefficient: ±100ppm/℃; ComponentLink1Description: Datasheet; ComponentLink1URL: https://wmsc.lcsc.com/wmsc/upload/file/pdf/v2/lcsc/2304140030_UNI-ROYAL-Uniroyal-Elec-CQ1007F680JT4E_C966258.pdf; ComponentLink2Description: JLCPCB Part URL; ComponentLink2URL: https://jlcpcb.com/partdetail/C966258
pins: 1, 2
1 alternate drawing of the same symbol

## CQ1007F750JT4E
designator R?  Resistance: 75Ω  (hidden comment: *)
Resistor, 75Ω, ±1%, 750mW, ±100ppm/℃, SMD 2010; Manufacturer: Uniroyal; Manufacturer Part Number: CQ1007F750JT4E; Supplier 1: LCSC; Supplier Part Number 1: C966253; JLCPCB Part Number: C966253; Power Rating: 750mW; Category: Resistors; Package Size: 2010; JLCPCB Basic Part: Yes; Tolerance: ±1%; Temperature Coefficient: ±100ppm/℃; ComponentLink1Description: Datasheet; ComponentLink1URL: https://wmsc.lcsc.com/wmsc/upload/file/pdf/v2/lcsc/2304140030_UNI-ROYAL-Uniroyal-Elec-CQ1007F750JT4E_C966253.pdf; ComponentLink2Description: JLCPCB Part URL; ComponentLink2URL: https://jlcpcb.com/partdetail/C966253
pins: 1, 2
1 alternate drawing of the same symbol

## CQ1007F910JT4E
designator R?  Resistance: 91Ω  (hidden comment: *)
Resistor, 91Ω, ±1%, 750mW, ±100ppm/℃, SMD 2010; Manufacturer: Uniroyal; Manufacturer Part Number: CQ1007F910JT4E; Supplier 1: LCSC; Supplier Part Number 1: C966248; JLCPCB Part Number: C966248; Power Rating: 750mW; Category: Resistors; Package Size: 2010; JLCPCB Basic Part: Yes; Tolerance: ±1%; Temperature Coefficient: ±100ppm/℃; ComponentLink1Description: Datasheet; ComponentLink1URL: https://wmsc.lcsc.com/wmsc/upload/file/pdf/v2/lcsc/2304140030_UNI-ROYAL-Uniroyal-Elec-CQ1007F910JT4E_C966248.pdf; ComponentLink2Description: JLCPCB Part URL; ComponentLink2URL: https://jlcpcb.com/partdetail/C966248
pins: 1, 2
1 alternate drawing of the same symbol

## CQ1007F1000T4E
designator R?  Resistance: 100Ω  (hidden comment: *)
Resistor, 100Ω, ±1%, 750mW, ±100ppm/℃, SMD 2010; Manufacturer: Uniroyal; Manufacturer Part Number: CQ1007F1000T4E; Supplier 1: LCSC; Supplier Part Number 1: C966297; JLCPCB Part Number: C966297; Power Rating: 750mW; Category: Resistors; Package Size: 2010; JLCPCB Basic Part: Yes; Tolerance: ±1%; Temperature Coefficient: ±100ppm/℃; ComponentLink1Description: Datasheet; ComponentLink1URL: https://wmsc.lcsc.com/wmsc/upload/file/pdf/v2/lcsc/2304140030_UNI-ROYAL-Uniroyal-Elec-CQ1007F1000T4E_C966297.pdf; ComponentLink2Description: JLCPCB Part URL; ComponentLink2URL: https://jlcpcb.com/partdetail/C966297
pins: 1, 2
1 alternate drawing of the same symbol

## CQ1007F1001T4E
designator R?  Resistance: 1kΩ  (hidden comment: *)
Resistor, 1kΩ, ±1%, 750mW, 200V, -55℃~+155℃, SMD 2010; Manufacturer: Uniroyal; Manufacturer Part Number: CQ1007F1001T4E; Supplier 1: LCSC; Supplier Part Number 1: C2771476; JLCPCB Part Number: C2771476; Power Rating: 750mW; Category: Resistors; Package Size: 2010; JLCPCB Basic Part: Yes; Tolerance: ±1%; Voltage Rating: 200V; Temperature Rating: -55℃~+155℃; ComponentLink1Description: Datasheet; ComponentLink1URL: https://wmsc.lcsc.com/wmsc/upload/file/pdf/v2/lcsc/2304140030_UNI-ROYAL-Uniroyal-Elec-CQ1007F1001T4E_C2771476.pdf; ComponentLink2Description: JLCPCB Part URL; ComponentLink2URL: https://jlcpcb.com/partdetail/C2771476
pins: 1, 2
1 alternate drawing of the same symbol

## CQ1007F1802T4E
designator R?  Resistance: 18kΩ  (hidden comment: *)
Resistor, 18kΩ, ±1%, 750mW, ±100ppm/℃, SMD 2010; Manufacturer: Uniroyal; Manufacturer Part Number: CQ1007F1802T4E; Supplier 1: LCSC; Supplier Part Number 1: C966289; JLCPCB Part Number: C966289; Power Rating: 750mW; Category: Resistors; Package Size: 2010; JLCPCB Basic Part: Yes; Tolerance: ±1%; Temperature Coefficient: ±100ppm/℃; ComponentLink1Description: Datasheet; ComponentLink1URL: https://wmsc.lcsc.com/wmsc/upload/file/pdf/v2/lcsc/2304140030_UNI-ROYAL-Uniroyal-Elec-CQ1007F1802T4E_C966289.pdf; ComponentLink2Description: JLCPCB Part URL; ComponentLink2URL: https://jlcpcb.com/partdetail/C966289
pins: 1, 2
1 alternate drawing of the same symbol

## CQ1007F2002T4E
designator R?  Resistance: 20kΩ  (hidden comment: *)
Resistor, 20kΩ, ±1%, 750mW, ±100ppm/℃, SMD 2010; Manufacturer: Uniroyal; Manufacturer Part Number: CQ1007F2002T4E; Supplier 1: LCSC; Supplier Part Number 1: C966287; JLCPCB Part Number: C966287; Power Rating: 750mW; Category: Resistors; Package Size: 2010; JLCPCB Basic Part: Yes; Tolerance: ±1%; Temperature Coefficient: ±100ppm/℃; ComponentLink1Description: Datasheet; ComponentLink1URL: https://wmsc.lcsc.com/wmsc/upload/file/pdf/v2/lcsc/2304140030_UNI-ROYAL-Uniroyal-Elec-CQ1007F2002T4E_C966287.pdf; ComponentLink2Description: JLCPCB Part URL; ComponentLink2URL: https://jlcpcb.com/partdetail/C966287
pins: 1, 2
1 alternate drawing of the same symbol